# Altium footprint library TYCO THD.PcbLib: 146 footprints (part 8 of 11)
Each footprint in its own frame and in the unit in brackets; x right, y up, seen from the top. Pads: shape width x height; smd on the part's side, far side on the other; paste and mask are expansions set on the pad; w line width, h text height; cw(c..) or ccw(c..) is an arc to the next point about the centre after c.
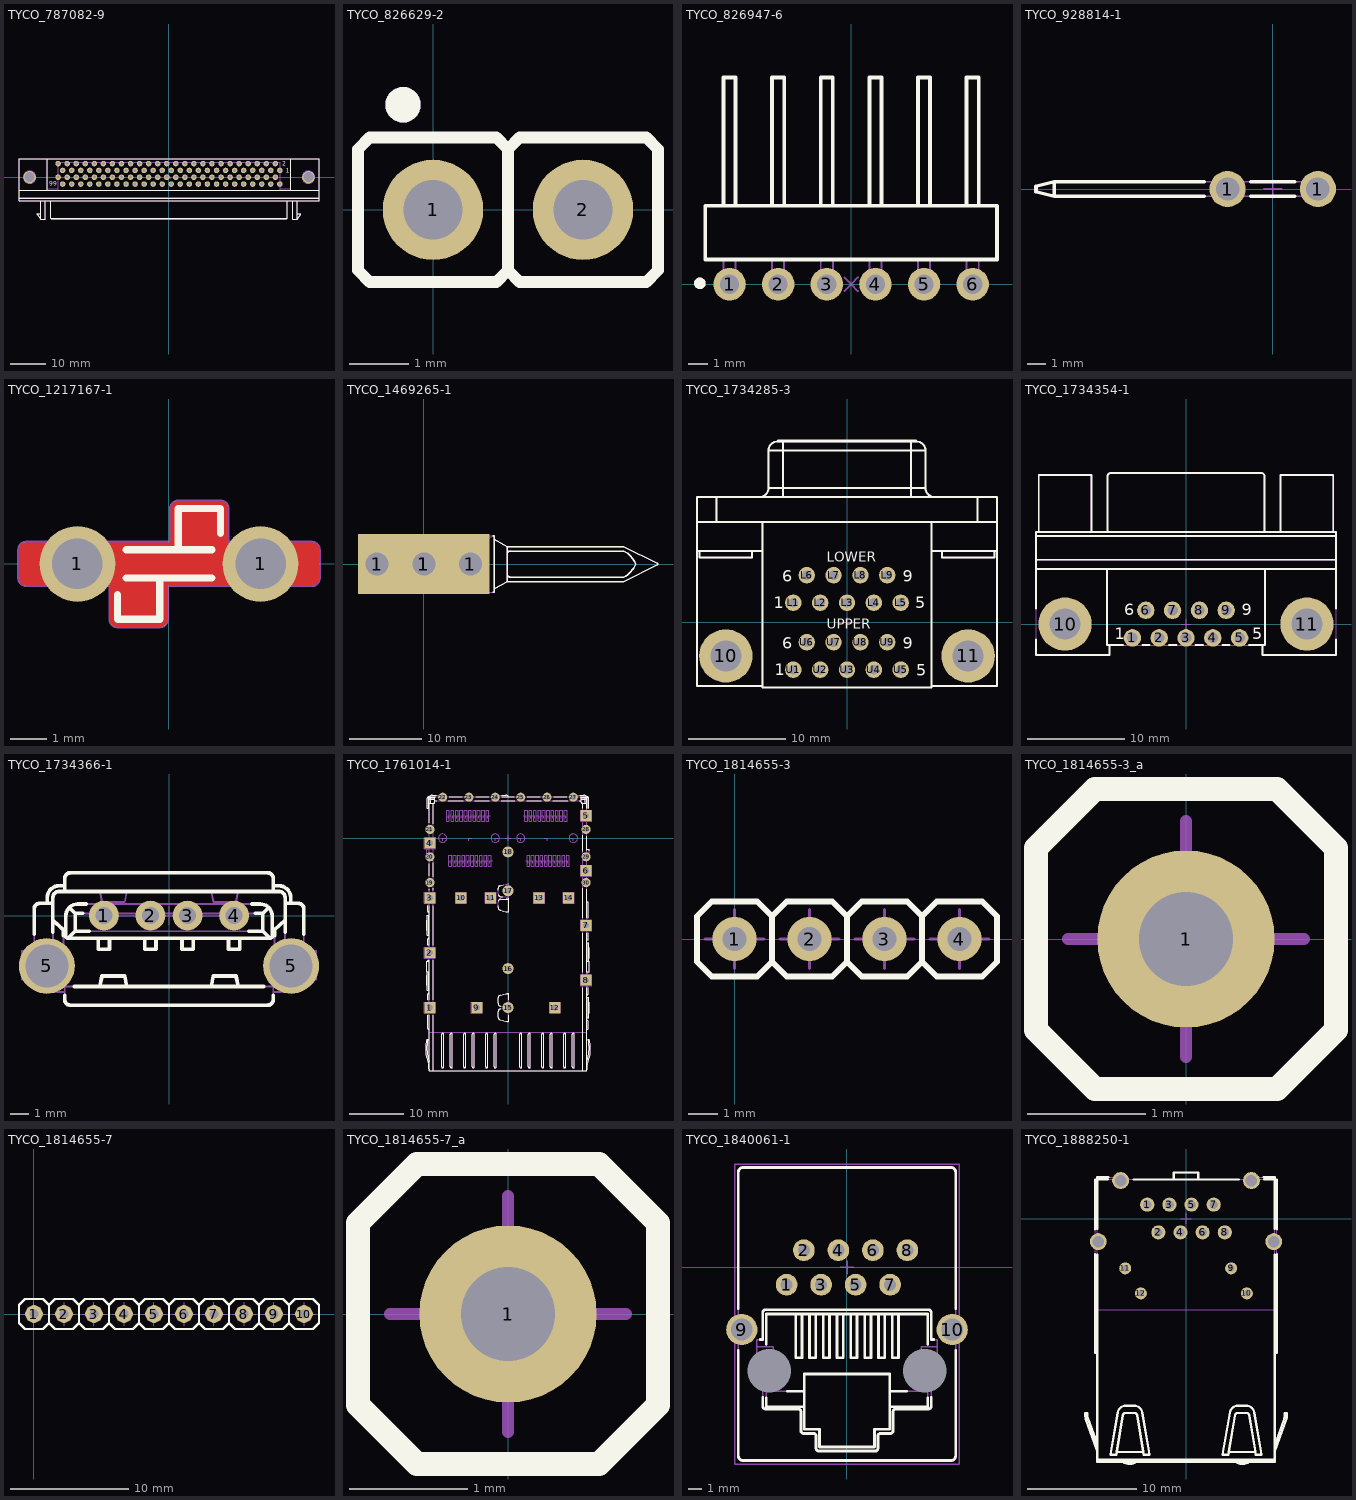
[diagram p7: the footprints below, top view; thin cyan lines are the x and y axes]

## TYCO_787082-9 [mm] "100 Positions, Right Angle D-Type Receptacle, .050 Series"
height 9.5
pads (102):
  round 1.55 hole 0.85: 1(31.115,1.905) 2(29.845,3.81) 3(28.575,1.905) 4(27.305,3.81) 5(26.035,1.905) 6(24.765,3.81) 7(23.495,1.905) 8(22.225,3.81) 9(20.955,1.905) 10(19.685,3.81) 11(18.415,1.905) 12(17.145,3.81) 13(15.875,1.905) 14(14.605,3.81) 15(13.335,1.905) 16(12.065,3.81) 17(10.795,1.905) 18(9.525,3.81) 19(8.255,1.905) 20(6.985,3.81) 21(5.715,1.905) 22(4.445,3.81) 23(3.175,1.905) 24(1.905,3.81) 25(0.635,1.905) 26(-0.635,3.81) 27(-1.905,1.905) 28(-3.175,3.81) 29(-4.445,1.905) 30(-5.715,3.81) 31(-6.985,1.905) 32(-8.255,3.81) 33(-9.525,1.905) 34(-10.795,3.81) 35(-12.065,1.905) 36(-13.335,3.81) 37(-14.605,1.905) 38(-15.875,3.81) 39(-17.145,1.905) 40(-18.415,3.81) 41(-19.685,1.905) 42(-20.955,3.81) 43(-22.225,1.905) 44(-23.495,3.81) 45(-24.765,1.905) 46(-26.035,3.81) 47(-27.305,1.905) 48(-28.575,3.81) 49(-29.845,1.905) 50(-31.115,3.81) 51(31.115,-1.905) 52(29.845,0) 53(28.575,-1.905) 54(27.305,0) 55(26.035,-1.905) 56(24.765,0) 57(23.495,-1.905) 58(22.225,0) 59(20.955,-1.905) 60(19.685,0) 61(18.415,-1.905) 62(17.145,0) 63(15.875,-1.905) 64(14.605,0) 65(13.335,-1.905) 66(12.065,0) 67(10.795,-1.905) 68(9.525,0) 69(8.255,-1.905) 70(6.985,0) 71(5.715,-1.905) 72(4.445,0) 73(3.175,-1.905) 74(1.905,0) 75(0.635,-1.905) 76(-0.635,0) 77(-1.905,-1.905) 78(-3.175,0) 79(-4.445,-1.905) 80(-5.715,0) 81(-6.985,-1.905) 82(-8.255,0) 83(-9.525,-1.905) 84(-10.795,0) 85(-12.065,-1.905) 86(-13.335,0) 87(-14.605,-1.905) 88(-15.875,0) 89(-17.145,-1.905) 90(-18.415,0) 91(-19.685,-1.905) 92(-20.955,0) 93(-22.225,-1.905) 94(-23.495,0) 95(-24.765,-1.905) 96(-26.035,0) 97(-27.305,-1.905) 98(-28.575,0) 99(-29.845,-1.905) 100(-31.115,0)
  round 3.5 hole 2.8: 101(39.115,0) 102(-39.115,0)
Top Overlay:
  lines w0.2: -42.1,-5.843 42.101,-5.843 ; -42.1,-3.633 42.101,-3.633 ; -36.004,-10.237 -37.02,-10.237 -37.02,-10.364 -36.004,-11.736 ; -36.004,-6.63 -36.004,-11.736 ; -34.671,-6.63 -34.671,-11.736 -36.004,-11.736 ; -34.163,-3.633 -34.163,5.13 ; -33.223,-6.63 -33.223,-11.532 33.223,-11.532 33.223,-6.63 ; -33.043,-11.532 -33.043,-11.634 33.043,-11.634 33.043,-11.532 ; 34.163,-3.633 34.163,5.13 ; 34.671,-6.63 34.671,-11.736 36.005,-11.736 ; 36.005,-10.237 37.021,-10.237 37.021,-10.364 36.005,-11.736 ; 36.005,-6.63 36.005,-11.736 ; -42.1,-6.63 42.101,-6.63 42.101,5.13 -42.1,5.13 -42.1,-6.63
  text "99" at -33.581,-2.448 h1.2
  text "1" at 32.8,1.3 h1.2
  text "2" at 31.769,3.237 h1.2
Mechanical 8:
  drawing of 418 lines, arcs and shapes, not listed
Mechanical 14:
  lines w0.1: -42.1,-5.843 42.101,-5.843 ; -42.1,-3.633 42.101,-3.633 ; -36.004,-10.237 -37.02,-10.237 -37.02,-10.364 -36.004,-11.736 ; -36.004,-6.63 -36.004,-11.736 ; -34.671,-6.63 -34.671,-11.736 -36.004,-11.736 ; -34.163,-3.633 -34.163,5.13 ; -34.163,-3.201 -31.267,-3.201 ; -33.223,-6.63 -33.223,-11.532 33.223,-11.532 33.223,-6.63 ; -33.043,-11.532 -33.043,-11.634 33.043,-11.634 33.043,-11.532 ; -31.258,-3.633 -31.267,4.164 31.267,4.165 31.267,-3.633 ; 31.267,-3.201 34.163,-3.201 ; 34.163,-3.633 34.163,5.13 ; 34.671,-6.63 34.671,-11.736 36.005,-11.736 ; 36.005,-10.237 37.021,-10.237 37.021,-10.364 36.005,-11.736 ; 36.005,-6.63 36.005,-11.736 ; -42.1,-6.63 42.101,-6.63 42.101,5.13 -42.1,5.13 -42.1,-6.63
  text "99" at -33.581,-2.448 h1.2
  text "51" at 32.25,-2.55 h1.2
  text "52" at 31.769,-0.573 h1.2
  text "2" at 31.769,3.237 h1.2
  text "1" at 32.8,1.3 h1.2
3D body "TYCO_787082-9.stp": height 9.5, standoff -3.81, extent -42.1,-11.735 42.101,5.13

## TYCO_826629-2 [mm] "2 Contacts Straight Strip Header Pitch 2.54mm L=6.7mm ''Mini-Wire-Wrap''"
height 9.5
pads (2):
  round 1.7 hole 1: 1(0,0) 2(2.54,0)
Top Overlay:
  circle w0.3: c-0.508,1.778 r0.15
  lines w0.2: 1.27,-1.025 1.07,-1.225 -1.07,-1.225 -1.27,-1.025 -1.27,1.025 -1.07,1.225 1.07,1.225 1.27,1.025 ; 1.27,-1.025 1.27,1.025 ; 1.27,-1.025 1.47,-1.225 3.61,-1.225 3.81,-1.025 3.81,1.025 3.61,1.225 1.47,1.225 1.27,1.025
Mechanical 14:
  circle w0.3: c-0.508,1.778 r0.15
  lines w0.1: 1.27,-1.025 1.07,-1.225 -1.07,-1.225 -1.27,-1.025 -1.27,1.025 -1.07,1.225 1.07,1.225 1.27,1.025 ; 1.27,-1.025 1.27,1.025 ; 1.27,-1.025 1.47,-1.225 3.61,-1.225 3.81,-1.025 3.81,1.025 3.61,1.225 1.47,1.225 1.27,1.025
3D body "TYCO_826629-2.stp": height 9.5, standoff -3.2, extent -1.22,-1.25 3.86,1.25

## TYCO_826947-6 [mm] "6 Positions, Pitch 2.54mm, Mating Post Length 6.7mm, Right Angle Header"
height 3.05
pads (6):
  round 1.7 hole 1: 1(-6.35,0) 2(-3.81,0) 3(-1.27,0) 4(1.27,0) 5(3.81,0) 6(6.35,0)
Top Overlay:
  circle w0.3: c-7.9,0.05 r0.15
  lines w0.2: -6.665,4.1 -6.665,10.8 -6.035,10.8 -6.035,4.1 ; -4.125,4.1 -4.125,10.8 -3.495,10.8 -3.495,4.1 ; -1.585,4.1 -1.585,10.8 -0.955,10.8 -0.955,4.1 ; 0.955,4.1 0.955,10.8 1.585,10.8 1.585,4.1 ; 3.495,4.1 3.495,10.8 4.125,10.8 4.125,4.1 ; 6.035,4.1 6.035,10.8 6.665,10.8 6.665,4.1 ; -7.62,1.3 -7.62,4.1 7.62,4.1 7.62,1.3 -7.62,1.3
Mechanical 8:
  lines w0.1: -6.35,-0.5 -6.35,0 ; -6.35,0.5 -6.35,0 ; -3.81,-0.5 -3.81,0 ; -3.81,0.5 -3.81,0 ; -1.27,-0.5 -1.27,0 ; -1.27,0.5 -1.27,0 ; -0.354,0.354 0,0 ; 0.354,-0.354 0,0 ; 1.27,-0.5 1.27,0 ; 1.27,0.5 1.27,0 ; 3.81,-0.5 3.81,0 ; 3.81,0.5 3.81,0 ; 6.35,-0.5 6.35,0 ; 6.35,0.5 6.35,0 ; -6.35,0 -5.85,0 -6.35,0 ; -6.35,0 -6.85,0 -6.35,0 ; -3.81,0 -3.31,0 -3.81,0 ; -3.81,0 -4.31,0 -3.81,0 ; -1.27,0 -0.77,0 -1.27,0 ; -1.27,0 -1.77,0 -1.27,0 ; 0,0 0.354,0.354 0,0 ; 0,0 -0.354,-0.354 0,0 ; 1.27,0 1.77,0 1.27,0 ; 1.27,0 0.77,0 1.27,0 ; 3.81,0 4.31,0 3.81,0 ; 3.81,0 3.31,0 3.81,0 ; 6.35,0 6.85,0 6.35,0 ; 6.35,0 5.85,0 6.35,0
Mechanical 14:
  circle w0.3: c-7.9,0.05 r0.15
  lines w0.1: -6.665,1.3 -6.665,-0.315 -6.035,-0.315 -6.035,1.3 ; -6.665,4.1 -6.665,10.8 -6.035,10.8 -6.035,4.1 ; -4.125,1.3 -4.125,-0.315 -3.495,-0.315 -3.495,1.3 ; -4.125,4.1 -4.125,10.8 -3.495,10.8 -3.495,4.1 ; -1.585,1.3 -1.585,-0.315 -0.955,-0.315 -0.955,1.3 ; -1.585,4.1 -1.585,10.8 -0.955,10.8 -0.955,4.1 ; 0.955,1.3 0.955,-0.315 1.585,-0.315 1.585,1.3 ; 0.955,4.1 0.955,10.8 1.585,10.8 1.585,4.1 ; 3.495,1.3 3.495,-0.315 4.125,-0.315 4.125,1.3 ; 3.495,4.1 3.495,10.8 4.125,10.8 4.125,4.1 ; 6.035,1.3 6.035,-0.315 6.665,-0.315 6.665,1.3 ; 6.035,4.1 6.035,10.8 6.665,10.8 6.665,4.1 ; -7.62,1.3 -7.62,4.1 7.62,4.1 7.62,1.3 -7.62,1.3
3D body "TYCO_826947-6.stp": height 3.05, standoff -3.2, extent -7.62,-0.315 7.62,10.8

## TYCO_928814-1 [mm] "Right Angle FASTON Solder Tab 6.3 x 0.8mm for PCB"
height 7.6
pads (2):
  round 2 hole 1.3: 1(-2.5,0) 1(2.5,0)
Top Overlay:
  lines w0.2: -3.789,-0.4 -12.1,-0.4 ; -3.789,0.4 -12.1,0.4 ; -1.211,-0.4 1.211,-0.4 ; -1.211,0.4 1.211,0.4 ; -12.1,-0.4 -13.1,-0.15 -13.1,0.15 -12.1,0.4 ; -12.1,-0.4 -12.1,0.4
Mechanical 8:
  lines w0.1: -3,0 -2.5,0 ; -2.5,-0.5 -2.5,0 ; -2.5,0.5 -2.5,0 ; -2,0 -2.5,0 ; -0.5,0 0,0 ; 0,-0.5 0,0 ; 0,0.5 0,0 ; 0.5,0 0,0 ; 2,0 2.5,0 ; 2.5,-0.5 2.5,0 ; 2.5,0.5 2.5,0 ; 3,0 2.5,0
Mechanical 14:
  lines w0.1: 1.9,-0.4 1.9,0.4 ; -12.1,-0.4 2.9,-0.4 2.9,0.4 -12.1,0.4 ; -12.1,-0.4 -13.1,-0.15 -13.1,0.15 -12.1,0.4 ; -12.1,-0.4 -12.1,0.4
3D body "TYCO_928814-1.stp": height 7.6, standoff -3.51, extent -13.1,-0.4 2.9,0.4

## TYCO_1217167-1 [mm] "6.3 x 0.8mm FASTON Tab for Printed Circuit Board"
height 16
pads (2):
  round 2.1 hole 1.4: 1(-2.54,0) 1(2.54,0)
Top Layer:
  region: -1.429,-1.741 -1.468,-1.741 -1.542,-1.71 -1.598,-1.654 -1.629,-1.58 -1.629,-1.541 -1.629,-0.598 -3.962,-0.598 -4.002,-0.598 -4.076,-0.567 -4.132,-0.511 -4.162,-0.437 -4.162,-0.398 -4.162,0.39 -4.162,0.43 -4.132,0.503 -4.076,0.559 -4.002,0.59 -3.962,0.59 0.054,0.59 0.054,1.533 0.054,1.573 0.085,1.646 0.141,1.702 0.214,1.733 0.254,1.733 1.429,1.733 1.469,1.733 1.542,1.702 1.598,1.646 1.629,1.573 1.629,1.533 1.629,0.59 3.963,0.59 4.002,0.59 4.076,0.559 4.132,0.503 4.163,0.43 4.163,0.39 4.163,-0.398 4.163,-0.437 4.132,-0.511 4.076,-0.567 4.002,-0.598 3.963,-0.598 -0.054,-0.598 -0.054,-1.541 -0.054,-1.58 -0.084,-1.654 -0.141,-1.71 -0.214,-1.741 -0.254,-1.741
Top Overlay:
  lines w0.2: -1.429,-0.852 -1.429,-1.537 -0.254,-1.537 -0.254,-0.394 ; -1.196,-0.394 1.197,-0.394 ; -1.196,0.394 1.197,0.394 ; -1.144,0.394 -0.116,0.394 ; 0.096,-0.394 1.145,-0.394 ; 0.254,0.394 0.254,1.537 1.429,1.537 1.429,0.852
Mechanical 8:
  lines w0.1: -3.04,0 -2.54,0 ; -2.54,-0.5 -2.54,0 ; -2.54,0.5 -2.54,0 ; -2.04,0 -2.54,0 ; -0.5,0 0,0 ; 0,-0.5 0,0 ; 0,0.5 0,0 ; 0.5,0 0,0 ; 2.04,0 2.54,0 ; 2.54,-0.5 2.54,0 ; 2.54,0.5 2.54,0 ; 3.04,0 2.54,0 ; -4.162,-0.394 ccw(c-3.962,-0.394) -3.962,-0.594 -1.629,-0.594 -1.629,-1.537 ccw(c-1.429,-1.537) -1.429,-1.737 -0.254,-1.737 ccw(c-0.254,-1.537) -0.054,-1.537 -0.054,-0.594 3.963,-0.594 ccw(c3.963,-0.394) 4.163,-0.394 4.163,0.394 ccw(c3.963,0.394) 3.963,0.594 1.629,0.594 1.629,1.537 ccw(c1.429,1.537) 1.429,1.737 0.254,1.737 ccw(c0.254,1.537) 0.054,1.537 0.054,0.594 -3.962,0.594 ccw(c-3.962,0.394) -4.162,0.394 -4.162,-0.394
Mechanical 14:
  lines w0.1: -1.429,-0.394 -1.429,-1.537 -0.254,-1.537 -0.254,-0.394 ; 0.254,0.394 0.254,1.537 1.429,1.537 1.429,0.394 ; -3.962,-0.394 3.963,-0.394 3.963,0.394 -3.962,0.394 -3.962,-0.394
3D body "TYCO_1217167-1.stp": height 16.26, standoff -3.56, extent -3.962,-1.537 3.963,1.537

## TYCO_1469265-1 [mm] "Universal Right Angle Male Power Module Guide (keyed)"
height 9.78
pads (4):
  round 3.9 hole 3.2: 1(-6.48,0) 1(6.48,0)
  rect 18.3x8.3 smd paste-4.15 mask-4.15: 1(0,0)
  round 6 hole 3.2: 1(0,0)
Top Overlay:
  lines w0.2: 9.58,-3.96 9.78,-3.96 9.78,3.94 9.58,3.94 ; 9.78,-3.474 11.58,-2.435 ; 9.78,3.454 11.58,2.415 ; 11.58,-1.474 ccw(c11.978,-1.416) 11.98,-1.819 27.78,-1.819 ccw(c26.372,1.115) 29.426,-0.01 ccw(c26.372,-1.135) 27.78,1.799 11.98,1.799 ccw(c11.978,1.396) 11.58,1.454 ; 11.58,-2.435 27.78,-2.435 32.48,-0.122 ccw(c32.425,-0.01) 32.48,0.102 27.78,2.415 11.58,2.415 ; 11.58,-2.435 11.58,2.415
Mechanical 8:
  circle w0.1: c0,0 r1.6
  circle w0.1: c6.48,0 r1.6
  circle w0.1: c6.48,0 r1.95
  circle w0.1: c0,0 r3
  circle w0.1: c-6.48,0 r1.95
  circle w0.1: c-6.48,0 r1.6
  lines w0.1: -8.92,-3.95 0.43,0 9.78,3.95 9.78,0 9.78,-3.95 ; -6.98,0 -6.48,0 ; -6.48,-0.5 -6.48,0 ; -6.48,0.5 -6.48,0 ; -5.98,0 -6.48,0 ; -0.5,0 0,0 ; 0,-0.5 0,0 ; 0,0.5 0,0 ; 0.5,0 0,0 ; 5.98,0 6.48,0 ; 6.48,-0.5 6.48,0 ; 6.48,0.5 6.48,0 ; 6.98,0 6.48,0
  text "PCB Edge" at 11.15,-3.425 h1
Mechanical 14:
  lines w0.1: 9.78,-3.464 11.58,-2.425 ; 9.78,3.464 11.58,2.425 ; 11.58,-1.464 ccw(c11.979,-1.406) 11.98,-1.809 27.78,-1.809 ccw(c26.372,1.125) 29.426,0 ccw(c26.372,-1.125) 27.78,1.809 ; 11.58,1.464 cw(c11.979,1.406) 11.98,1.809 ; 11.58,-2.425 11.58,2.425 ; 11.58,-2.425 27.78,-2.425 32.48,-0.112 ccw(c32.425,0) 32.48,0.112 27.78,2.425 11.58,2.425 ; -8.92,-3.95 -8.92,3.95 9.78,3.95 9.78,-3.95 -8.92,-3.95
3D body "TYCO_1469265-1.stp": height 9.7, standoff -4, extent -8.92,-3.95 32.531,3.95

## TYCO_1734285-3 [mm] "Dual Stacked  Right Angled D-SUB 9 Pins Female Connector, With Threaded Insert UNC 4-40, And PCB Mount Retention"
height 31.9
pads (20):
  round 5.5 hole 3.2: 10(-12.495,-3.455) 11(12.495,-3.455)
  round 1.7 hole 1: L1(-5.54,2.035) L2(-2.77,2.035) L3(0,2.035) L4(2.77,2.035) L5(5.54,2.035) L6(-4.155,4.875) L7(-1.385,4.875) L8(1.385,4.875) L9(4.155,4.875) U1(-5.54,-4.875) U2(-2.77,-4.875) U3(0,-4.875) U4(2.77,-4.875) U5(5.54,-4.875) U6(-4.155,-2.035) U7(-1.385,-2.035) U8(1.385,-2.035) U9(4.155,-2.035)
Top Overlay:
  lines w0.2: -15.475,7.355 -8.725,7.355 ; -15.475,10.355 15.475,10.355 ; -15.195,7.355 -15.195,6.691 -9.795,6.691 -9.795,7.355 ; -13.475,10.355 -13.475,12.955 ; -9,12.955 ccw(c-9,13.855) -8.1,13.855 ; -8.725,-6.545 -15.475,-6.545 -15.475,12.955 15.475,12.955 15.475,-6.545 8.725,-6.545 ; -8.725,10.355 -8.725,-6.695 8.725,-6.695 8.725,10.355 ; -7.1,18.655 -7.1,18.755 7.1,18.755 7.1,18.655 ; -6.6,12.955 -6.6,18.755 ; 6.6,12.955 6.6,18.755 ; 8.725,7.355 15.475,7.355 ; 9,12.955 cw(c9,13.855) 8.1,13.855 ; 9.795,7.355 9.795,6.691 15.195,6.691 15.195,7.355 ; 13.475,10.355 13.475,12.955 ; -8.1,13.855 -8.1,17.755 ; -8.1,13.855 8.1,13.855 ; -8.1,17.755 cw(c-7.2,17.755) -7.2,18.655 7.199,18.655 cw(c7.2,17.755) 8.1,17.755 ; -8.1,17.755 8.1,17.755 ; 8.1,13.855 8.1,17.755
  text "9" at 5.726,4.188 h1.2
  text "5" at 7.041,1.473 h1.2
  text "5" at 7.141,-5.487 h1.2
  text "9" at 5.726,-2.722 h1.2
  text "LOWER" at -2.1,6.26 h1
  text "UPPER" at -2.1,-0.65 h1
  text "1" at -7.549,1.448 h1.2
  text "6" at -6.661,4.188 h1.2
  text "6" at -6.661,-2.722 h1.2
  text "1" at -7.474,-5.462 h1.2
Mechanical 7:
  lines w0.1: -12.995,-3.455 -12.495,-3.455 ; -12.495,-3.955 -12.495,-3.455 ; -12.495,-2.955 -12.495,-3.455 ; -11.995,-3.455 -12.495,-3.455 ; 11.995,-3.455 12.495,-3.455 ; 12.495,-3.955 12.495,-3.455 ; 12.495,-2.955 12.495,-3.455 ; 12.995,-3.455 12.495,-3.455
Mechanical 8:
  lines w0.1: -6.04,-4.875 -5.54,-4.875 ; -6.04,2.035 -5.54,2.035 ; -5.54,-5.375 -5.54,-4.875 ; -5.54,-4.375 -5.54,-4.875 ; -5.54,1.535 -5.54,2.035 ; -5.54,2.535 -5.54,2.035 ; -5.04,-4.875 -5.54,-4.875 ; -5.04,2.035 -5.54,2.035 ; -4.655,-2.035 -4.155,-2.035 ; -4.655,4.875 -4.155,4.875 ; -4.155,-2.535 -4.155,-2.035 ; -4.155,-1.535 -4.155,-2.035 ; -4.155,4.375 -4.155,4.875 ; -4.155,5.375 -4.155,4.875 ; -3.655,-2.035 -4.155,-2.035 ; -3.655,4.875 -4.155,4.875 ; -3.27,-4.875 -2.77,-4.875 ; -3.27,2.035 -2.77,2.035 ; -2.77,-5.375 -2.77,-4.875 ; -2.77,-4.375 -2.77,-4.875 ; -2.77,1.535 -2.77,2.035 ; -2.77,2.535 -2.77,2.035 ; -2.27,-4.875 -2.77,-4.875 ; -2.27,2.035 -2.77,2.035 ; -1.885,-2.035 -1.385,-2.035 ; -1.885,4.875 -1.385,4.875 ; -1.385,-2.535 -1.385,-2.035 ; -1.385,-1.535 -1.385,-2.035 ; -1.385,4.375 -1.385,4.875 ; -1.385,5.375 -1.385,4.875 ; -0.885,-2.035 -1.385,-2.035 ; -0.885,4.875 -1.385,4.875 ; -0.5,-4.875 0,-4.875 ; -0.5,0 0,0 ; -0.5,2.035 0,2.035 ; 0,-5.375 0,-4.875 ; 0,-4.375 0,-4.875 ; 0,-0.5 0,0 ; 0,0.5 0,0 ; 0,1.535 0,2.035 ; 0,2.535 0,2.035 ; 0.5,-4.875 0,-4.875 ; 0.5,0 0,0 ; 0.5,2.035 0,2.035 ; 0.885,-2.035 1.385,-2.035 ; 0.885,4.875 1.385,4.875 ; 1.385,-2.535 1.385,-2.035 ; 1.385,-1.535 1.385,-2.035 ; 1.385,4.375 1.385,4.875 ; 1.385,5.375 1.385,4.875 ; 1.885,-2.035 1.385,-2.035 ; 1.885,4.875 1.385,4.875 ; 2.27,-4.875 2.77,-4.875 ; 2.27,2.035 2.77,2.035 ; 2.77,-5.375 2.77,-4.875 ; 2.77,-4.375 2.77,-4.875 ; 2.77,1.535 2.77,2.035 ; 2.77,2.535 2.77,2.035 ; 3.27,-4.875 2.77,-4.875 ; 3.27,2.035 2.77,2.035 ; 3.655,-2.035 4.155,-2.035 ; 3.655,4.875 4.155,4.875 ; 4.155,-2.535 4.155,-2.035 ; 4.155,-1.535 4.155,-2.035 ; 4.155,4.375 4.155,4.875 ; 4.155,5.375 4.155,4.875 ; 4.655,-2.035 4.155,-2.035 ; 4.655,4.875 4.155,4.875 ; 5.04,-4.875 5.54,-4.875 ; 5.04,2.035 5.54,2.035 ; 5.54,-5.375 5.54,-4.875 ; 5.54,-4.375 5.54,-4.875 ; 5.54,1.535 5.54,2.035 ; 5.54,2.535 5.54,2.035 ; 6.04,-4.875 5.54,-4.875 ; 6.04,2.035 5.54,2.035
Mechanical 14:
  drawing of 6657 lines, arcs and shapes, not listed
  text "LOWER" at -2.1,6.26 h1
  text "UPPER" at -2.1,-0.65 h1
  text "1" at -7.474,-5.462 h1.2
  text "6" at -6.661,-2.722 h1.2
  text "6" at -6.661,4.188 h1.2
  text "1" at -7.549,1.448 h1.2
  text "9" at 5.726,-2.722 h1.2
  text "5" at 7.141,-5.487 h1.2
  text "5" at 7.041,1.473 h1.2
  text "9" at 5.726,4.188 h1.2
3D body "TYCO_1734285-3.stp": height 31.6, standoff -3.55, extent -15.475,-6.695 15.475,18.805

## TYCO_1734354-1 [mm] "Right Angle D-SUB 9 Female Contacts, Shell Size 9, With Threaded Insert (4-40 UNC). AMPLIMITE HD-20 Series"
height 12.75
pads (11):
  round 1.8 hole 1.1: 1(-5.54,-1.422) 2(-2.77,-1.422) 3(0,-1.422) 4(2.77,-1.422) 5(5.54,-1.422) 6(-4.15,1.422) 7(-1.385,1.422) 8(1.385,1.422) 9(4.15,1.422)
  round 5.5 hole 3.2 unplated mask+0.102: 10(-12.495,0)
  round 5.5 hole 3.2: 11(12.495,0)
Top Overlay:
  lines w0.2: -15.494,-1.6 -15.494,-3.185 -7.899,-3.185 -7.899,-2.169 ; -15.494,1.6 -15.494,9.525 15.494,9.525 15.494,1.6 ; -15.494,5.679 15.494,5.679 ; -15.494,6.645 15.494,6.645 ; -15.494,9.108 15.494,9.108 ; -15.209,9.525 -15.209,15.408 -9.781,15.408 -9.781,9.525 ; -8.153,5.679 -8.153,-2.169 -6.482,-2.169 ; -8.1,9.525 -8.1,15.296 cw(c-7.8,15.296) -7.8,15.596 7.8,15.596 cw(c7.8,15.296) 8.1,15.296 8.1,9.525 ; -4.478,-2.169 -3.742,-2.169 ; -1.738,-2.169 -1.002,-2.169 ; 1.002,-2.169 1.738,-2.169 ; 3.742,-2.169 4.478,-2.169 ; 6.482,-2.169 8.153,-2.169 8.153,5.679 ; 7.899,-2.169 7.899,-3.185 15.494,-3.185 15.494,-1.6 ; 9.781,9.525 9.781,15.408 15.209,15.408 15.209,9.525
  text "9" at 5.75,0.925 h1.2
  text "1" at -7.35,-1.575 h1.2
  text "5" at 6.85,-1.575 h1.2
  text "6" at -6.375,0.925 h1.2
Mechanical 8:
  circle w0.05: c-12.495,0 r1.6
  circle w0.05: c12.495,0 r1.6
  circle w0.05: c-4.15,1.422 r0.5
  circle w0.05: c-5.54,-1.422 r0.5
  circle w0.05: c4.15,1.422 r0.5
  circle w0.05: c5.54,-1.422 r0.5
  lines w0.05: -12.995,0 -12.495,0 ; -12.495,-0.5 -12.495,0 ; -12.495,0.5 -12.495,0 ; -11.995,0 -12.495,0 ; -6.04,-1.422 -5.54,-1.422 ; -5.54,-1.922 -5.54,-1.422 ; -5.54,-0.922 -5.54,-1.422 ; -5.04,-1.422 -5.54,-1.422 ; -4.65,1.422 -4.15,1.422 ; -4.15,0.922 -4.15,1.422 ; -4.15,1.922 -4.15,1.422 ; -3.65,1.422 -4.15,1.422 ; -3.27,-1.422 -2.77,-1.422 ; -2.77,-1.922 -2.77,-1.422 ; -2.77,-0.922 -2.77,-1.422 ; -2.27,-1.422 -2.77,-1.422 ; -1.885,1.422 -1.385,1.422 ; -1.385,0.922 -1.385,1.422 ; -1.385,1.922 -1.385,1.422 ; -0.885,1.422 -1.385,1.422 ; -0.5,-1.422 0,-1.422 ; -0.5,0 0,0 ; 0,-1.922 0,-1.422 ; 0,-0.922 0,-1.422 ; 0,-0.5 0,0 ; 0,0.5 0,0 ; 0.5,-1.422 0,-1.422 ; 0.5,0 0,0 ; 0.885,1.422 1.385,1.422 ; 1.385,0.922 1.385,1.422 ; 1.385,1.922 1.385,1.422 ; 1.885,1.422 1.385,1.422 ; 2.27,-1.422 2.77,-1.422 ; 2.77,-1.922 2.77,-1.422 ; 2.77,-0.922 2.77,-1.422 ; 3.27,-1.422 2.77,-1.422 ; 3.65,1.422 4.15,1.422 ; 4.15,0.922 4.15,1.422 ; 4.15,1.922 4.15,1.422 ; 4.65,1.422 4.15,1.422 ; 5.04,-1.422 5.54,-1.422 ; 5.54,-1.922 5.54,-1.422 ; 5.54,-0.922 5.54,-1.422 ; 6.04,-1.422 5.54,-1.422 ; 11.995,0 12.495,0 ; 12.495,-0.5 12.495,0 ; 12.495,0.5 12.495,0 ; 12.995,0 12.495,0
Mechanical 14:
  circle w0.1: c-12.497,0 r1.854
  circle w0.1: c-12.497,0 r1.549
  circle w0.1: c12.497,0 r1.854
  circle w0.1: c12.497,0 r1.549
  lines w0.1: -15.494,5.679 15.494,5.679 ; -15.494,6.645 15.494,6.645 ; -15.494,9.108 15.494,9.108 ; -15.209,9.525 -15.209,15.408 -9.781,15.408 -9.781,9.525 ; -8.153,5.679 -8.153,-2.169 8.153,-2.169 8.153,5.679 ; -8.1,9.525 -8.1,15.296 cw(c-7.8,15.296) -7.8,15.596 7.8,15.596 cw(c7.8,15.296) 8.1,15.296 8.1,9.525 ; -7.899,-2.169 -7.899,-3.185 -15.494,-3.185 -15.494,9.525 15.494,9.525 15.494,-3.185 7.899,-3.185 7.899,-2.169 ; 9.781,9.525 9.781,15.408 15.209,15.408 15.209,9.525
  text "6" at -6.375,0.925 h1.2
  text "5" at 6.85,-1.575 h1.2
  text "1" at -7.35,-1.575 h1.2